# Altium footprint library 20.Optical.PcbLib: 40 footprints (part 2 of 3)
Each footprint in its own frame and in the unit in brackets; x right, y up, seen from the top. Pads: shape width x height; smd on the part's side, far side on the other; paste and mask are expansions set on the pad; w line width, h text height; cw(c..) or ccw(c..) is an arc to the next point about the centre after c.
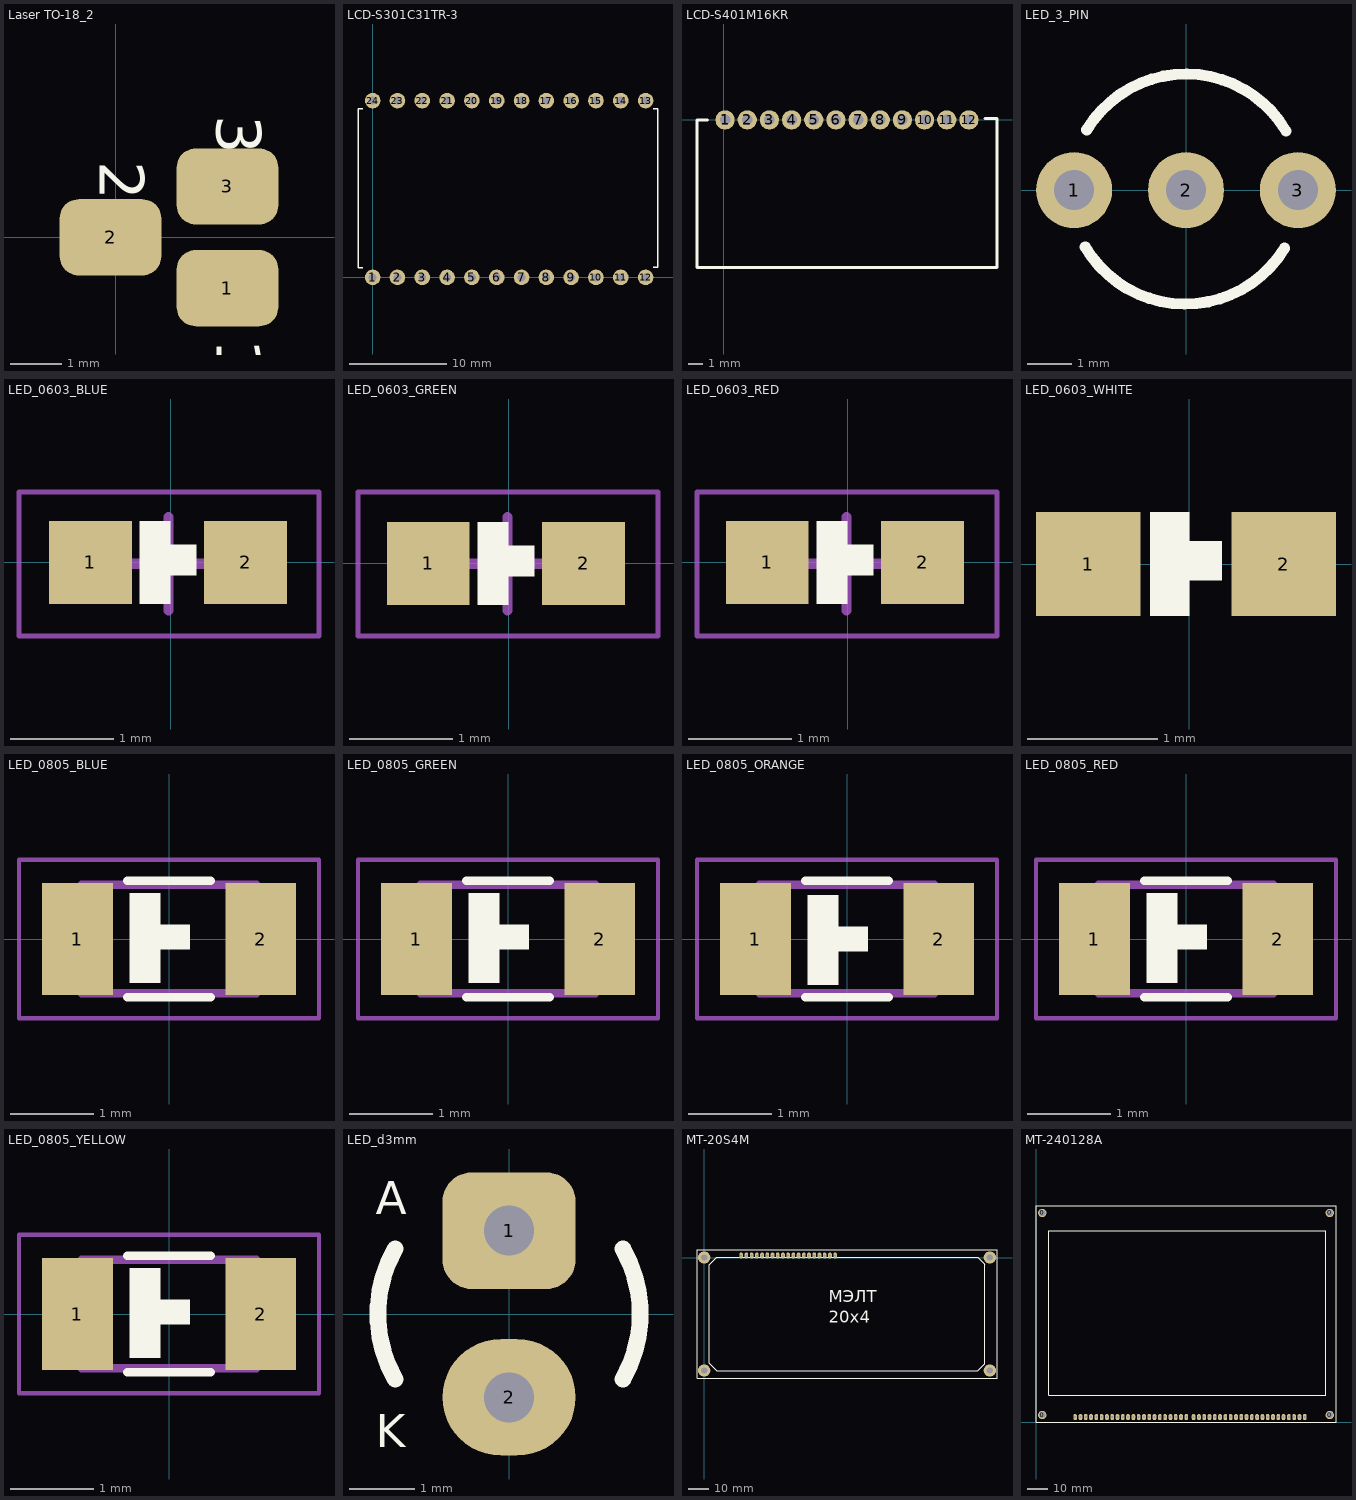
[diagram p1: the footprints below, top view; thin cyan lines are the x and y axes]

## Laser TO-18_2 [mm]
pads (3):
  rrect50% 2x1.5 smd: 1(2.2,-1) 2(-0.1,0) 3(2.2,1)
Top Overlay:
  text "2" at -0.6,1.5 h1.5
  text "1" at 1.7,-2 h1.5
  text "3" at 1.7,2.4 h1.5
3D body "объектив лазера.SLDPRT": height 8, standoff 0, extent 4.219,-4.197 17.219,3.797
3D body "ld_to18_5_6mm_SONY SLD3232VF.STEP": height 6.75, standoff 1.2, extent -2.3,-2.9 7.7,2.65

## LCD-S301C31TR-3 [mm]
pads (24):
  round 1.6 hole 0.8: 1(0,0) 2(2.54,0) 3(5.08,0) 4(7.62,0) 5(10.16,0) 6(12.7,0) 7(15.24,0) 8(17.78,0) 9(20.32,0) 10(22.86,0) 11(25.4,0) 12(27.94,0) 13(27.94,18.1) 14(25.4,18.1) 15(22.86,18.1) 16(20.32,18.1) 17(17.78,18.1) 18(15.24,18.1) 19(12.7,18.1) 20(10.16,18.1) 21(7.62,18.1) 22(5.08,18.1) 23(2.54,18.1) 24(0,18.1)
Top Overlay:
  lines w0.15: -1,1 -1.5,1 -1.5,17.25 -1,17.25 ; 28.712,1.033 29.212,1.033 29.212,17.283 28.712,17.283
3D body: height 2.8, standoff 2, extent -1.461,1.005 29.289,17.255

## LCD-S401M16KR [mm]
pads (12):
  round 1.3 hole 0.7: 1(0.1,0) 2(1.6,0) 3(3.1,0) 4(4.6,0) 5(6.1,0) 6(7.6,0) 7(9.1,0) 8(10.6,0) 9(12.1,0) 10(13.6,0) 11(15.1,0) 12(16.6,0)
Top Overlay:
  lines w0.2: -1.1,0 -1.8,0 -1.8,-10 18.5,-10 18.5,0.1 17.7,0.1
3D body: height 2.8, standoff 0, extent -1.85,-10 18.45,0.1

## LED_3_PIN [mm]
pads (3):
  round 1.7 hole 0.9: 1(-2.5,0) 2(0,0) 3(2.5,0)
Top Overlay:
  lines w0.25: -2.249,-1.271 ccw(c-0.016,0.049) 2.2,-1.3 ; -2.216,1.349 cw(c0,0) 2.233,1.32
3D body "User Library-led 3mm 3 pin.STEP": height 25, standoff -4.4, extent -2.89,-2.049 2.89,1.651

## LED_0603_BLUE [mm]
pads (2):
  rect 0.8x0.8 smd: 1(-0.775,0) 2(0.725,0)
Top Overlay:
  rectangle: -0.3,-0.4 0,0.4
  rectangle: -0.1,-0.125 0.25,0.175
Mechanical 15:
  lines w0.05: -1.465,-0.712 1.435,-0.712 1.435,0.682 -1.465,0.682 -1.465,-0.712
  lines w0.1: -0.465,-0.012 0.435,-0.012 ; -0.019,-0.462 -0.019,0.438
3D body "User Library-LED_0603_G.STEP": height 0.6, standoff 0, extent -0.8,-0.4 0.8,0.4
3D body: height 0.65, standoff 0, extent -0.5,-0.35 0.5,0.35

## LED_0603_GREEN [mm]
pads (2):
  rect 0.8x0.8 smd: 1(-0.775,0) 2(0.725,0)
Top Overlay:
  rectangle: -0.3,-0.4 0,0.4
  rectangle: -0.1,-0.125 0.25,0.175
Mechanical 15:
  lines w0.05: -1.455,-0.703 1.445,-0.703 1.445,0.692 -1.455,0.692 -1.455,-0.703
  lines w0.1: -0.455,-0.003 0.445,-0.003 ; -0.009,-0.453 -0.009,0.447
3D body "User Library-LED_0603_G.STEP": height 0.6, standoff 0, extent -0.8,-0.4 0.8,0.4

## LED_0603_RED [mm]
pads (2):
  rect 0.8x0.8 smd: 1(-0.775,0) 2(0.725,0)
Top Overlay:
  rectangle: -0.1,-0.125 0.25,0.175
  rectangle: -0.3,-0.4 0,0.4
Mechanical 15:
  lines w0.05: -1.455,-0.712 1.445,-0.712 1.445,0.682 -1.455,0.682 -1.455,-0.712
  lines w0.1: -0.455,-0.012 0.445,-0.012 ; -0.009,-0.462 -0.009,0.438
3D body "User Library-LED_0603_G.STEP": height 0.6, standoff 0, extent -0.8,-0.4 0.8,0.4
3D body: height 0.65, standoff 0, extent -0.5,-0.35 0.5,0.35

## LED_0603_WHITE [mm]
pads (2):
  rect 0.8x0.8 smd: 1(-0.775,0) 2(0.725,0)
Top Overlay:
  rectangle: -0.1,-0.125 0.25,0.175
  rectangle: -0.3,-0.4 0,0.4
3D body "User Library-LED_0603_G.STEP": height 0.6, standoff 0, extent -0.8,-0.4 0.8,0.4
3D body: height 0.65, standoff 0, extent -0.5,-0.35 0.5,0.35

## LED_0805_BLUE [mm]
pads (2):
  rect 0.85x1.35 smd: 1(-1.1,0) 2(1.1,0)
Top Overlay:
  rectangle: -0.1,-0.125 0.25,0.175
  rectangle: -0.475,-0.525 -0.1,0.55
  lines w0.1: -0.5,-0.7 0.5,-0.7 ; -0.5,0.7 0.5,0.7
Mechanical 13:
  lines w0.1: -1.05,-0.65 -1.05,0.65 1.05,0.65 1.05,-0.65 -1.05,-0.65
Mechanical 15:
  lines w0.05: -1.8,-0.95 -1.8,0.95 1.8,0.95 1.8,-0.95 -1.8,-0.95
3D body "User Library-led_0805_blue.step": height 1.1, standoff 0, extent -1.06,-0.625 0.96,0.625

## LED_0805_GREEN [mm]
pads (2):
  rect 0.85x1.35 smd: 1(-1.1,0) 2(1.1,0)
Top Overlay:
  rectangle: -0.475,-0.525 -0.1,0.55
  rectangle: -0.1,-0.125 0.25,0.175
  lines w0.1: -0.5,-0.7 0.5,-0.7 ; -0.5,0.7 0.5,0.7
Mechanical 13:
  lines w0.1: -1.05,-0.65 -1.05,0.65 1.05,0.65 1.05,-0.65 -1.05,-0.65
Mechanical 15:
  lines w0.05: -1.8,-0.95 -1.8,0.95 1.8,0.95 1.8,-0.95 -1.8,-0.95
3D body "User Library-led_0805_green.step": height 1.1, standoff 0, extent -1.01,-0.625 1.01,0.625

## LED_0805_ORANGE [mm]
pads (2):
  rect 0.85x1.35 smd: 1(-1.1,0) 2(1.1,0)
Top Overlay:
  rectangle: -0.475,-0.55 -0.1,0.525
  rectangle: -0.1,-0.15 0.25,0.15
  lines w0.1: -0.5,-0.7 0.5,-0.7 ; -0.5,0.7 0.5,0.7
Mechanical 13:
  lines w0.1: -1.05,-0.65 -1.05,0.65 1.05,0.65 1.05,-0.65 -1.05,-0.65
Mechanical 15:
  lines w0.05: -1.8,-0.95 -1.8,0.95 1.8,0.95 1.8,-0.95 -1.8,-0.95
3D body "User Library-led_0805_orange.step": height 1.1, standoff 0, extent -1.11,-0.625 0.91,0.625

## LED_0805_RED [mm]
pads (2):
  rect 0.85x1.35 smd: 1(-1.1,0) 2(1.1,0)
Top Overlay:
  rectangle: -0.475,-0.525 -0.1,0.55
  rectangle: -0.1,-0.125 0.25,0.175
  lines w0.1: -0.5,-0.7 0.5,-0.7 ; -0.5,0.7 0.5,0.7
Mechanical 13:
  lines w0.1: -1.05,-0.65 -1.05,0.65 1.05,0.65 1.05,-0.65 -1.05,-0.65
Mechanical 15:
  lines w0.05: -1.8,-0.95 -1.8,0.95 1.8,0.95 1.8,-0.95 -1.8,-0.95
3D body "User Library-led_0805_red.step": height 1.1, standoff 0, extent -1.11,-0.625 0.91,0.625

## LED_0805_YELLOW [mm]
pads (2):
  rect 0.85x1.35 smd: 1(-1.1,0) 2(1.1,0)
Top Overlay:
  rectangle: -0.475,-0.525 -0.1,0.55
  rectangle: -0.1,-0.125 0.25,0.175
  lines w0.1: -0.5,-0.7 0.5,-0.7 ; -0.5,0.7 0.5,0.7
Mechanical 13:
  lines w0.1: -1.05,-0.65 1.05,-0.65 1.05,0.65 -1.05,0.65 -1.05,-0.65
Mechanical 15:
  lines w0.05: -1.8,-0.95 1.8,-0.95 1.8,0.95 -1.8,0.95 -1.8,-0.95
3D body "User Library-led_0805_yellow.step": height 1.1, standoff 0, extent -1.11,-0.625 0.91,0.625

## LED_d3mm [mil] "Светодиод. Диаметр - 3мм."
height 220.47
pads (2):
  rrect50% 80x70 hole 30: 1(0,50)
  oval 80x70 hole 30: 2(0,-50)
Top Overlay:
  lines w10: -68.37,-39.07 cw(c0,0) -68.37,39.07 ; 68.37,-39.07 ccw(c0,0) 68.37,39.07
  text "K" at -80,-80 h20
  text "A" at -80,60 h20
3D body "LED DIP Red d3mm.step": height 255.91, standoff -78.74, extent -75,-62.9 74.61,74.9

## MT-20S4M [mm]
pads (23):
  oval 1.8x3 hole 1: 1(18,1) 2(20.54,1) 3(23.08,1) 4(25.62,1) 5(28.16,1) 6(30.7,1) 7(33.24,1) 8(35.78,1) 9(38.32,1) 10(40.86,1) 11(43.4,1) 12(45.94,1) 13(48.48,1) 14(51.02,1) 15(53.56,1) 16(56.1,1) 17(58.64,1) 18(61.18,1) 19(63.72,1)
  round 6 hole 3: HOLE(0,-54.95) HOLE(0,0.05) HOLE(139,-54.95) HOLE(139,0.05)
Top Overlay:
  lines w0.3: -3.5,-58.7 -3.5,3.8 142.5,3.8 142.5,-58.7 -3.5,-58.7 ; 2.5,-51.45 2.5,-3.45 6,0.05 133.25,0.05 136.5,-3.2 136.5,-51.7 133.25,-54.95 6,-54.95 2.5,-51.45
  text "МЭЛТ / 20х4" at 60.5,-33.7 h10
3D body: height 11, standoff 10, extent 4,-52.2 135,-1.7
3D body: height 10, standoff 8, extent -3.5,-58.7 142.5,3.8

## MT-240128A [mm]
pads (48):
  round 4 hole 3: 0(3,3.5) 0(3,100.5) 0(141,3.5) 0(141,100.5)
  oval 1.8x3 hole 1: 1(129,2.5) 2(126.46,2.5) 3(123.92,2.5) 4(121.38,2.5) 5(118.84,2.5) 6(116.3,2.5) 7(113.76,2.5) 8(111.22,2.5) 9(108.68,2.5) 10(106.14,2.5) 11(103.6,2.5) 12(101.06,2.5) 13(98.52,2.5) 14(95.98,2.5) 15(93.44,2.5) 16(90.9,2.5) 17(88.36,2.5) 18(85.82,2.5) 19(83.28,2.5) 20(80.74,2.5) 21(78.2,2.5) 22(75.66,2.5) NC(18.8,2.5) NC(21.34,2.5) NC(23.88,2.5) NC(26.42,2.5) NC(28.96,2.5) NC(31.5,2.5) NC(34.04,2.5) NC(36.58,2.5) NC(39.12,2.5) NC(41.66,2.5) NC(44.2,2.5) NC(46.74,2.5) NC(49.28,2.5) NC(51.82,2.5) NC(54.36,2.5) NC(56.9,2.5) NC(59.44,2.5) NC(61.98,2.5) NC(64.52,2.5) NC(67.06,2.5) NC(69.6,2.5) NC(72.14,2.5)
Top Overlay:
  lines w0.2: 0,0 144,0 144,104 0,104 0,0 ; 6,13 139,13 139,92 6,92 6,13
3D body "User Library-TS240128D.step": height 15.38, standoff 3.05, extent 0,0 144,104